# Altium footprint library GBA_V1.PcbLib: 43 footprints (part 1 of 3)
Each footprint in its own frame and in the unit in brackets; x right, y up, seen from the top. Pads: shape width x height; smd on the part's side, far side on the other; paste and mask are expansions set on the pad; w line width, h text height; cw(c..) or ccw(c..) is an arc to the next point about the centre after c.
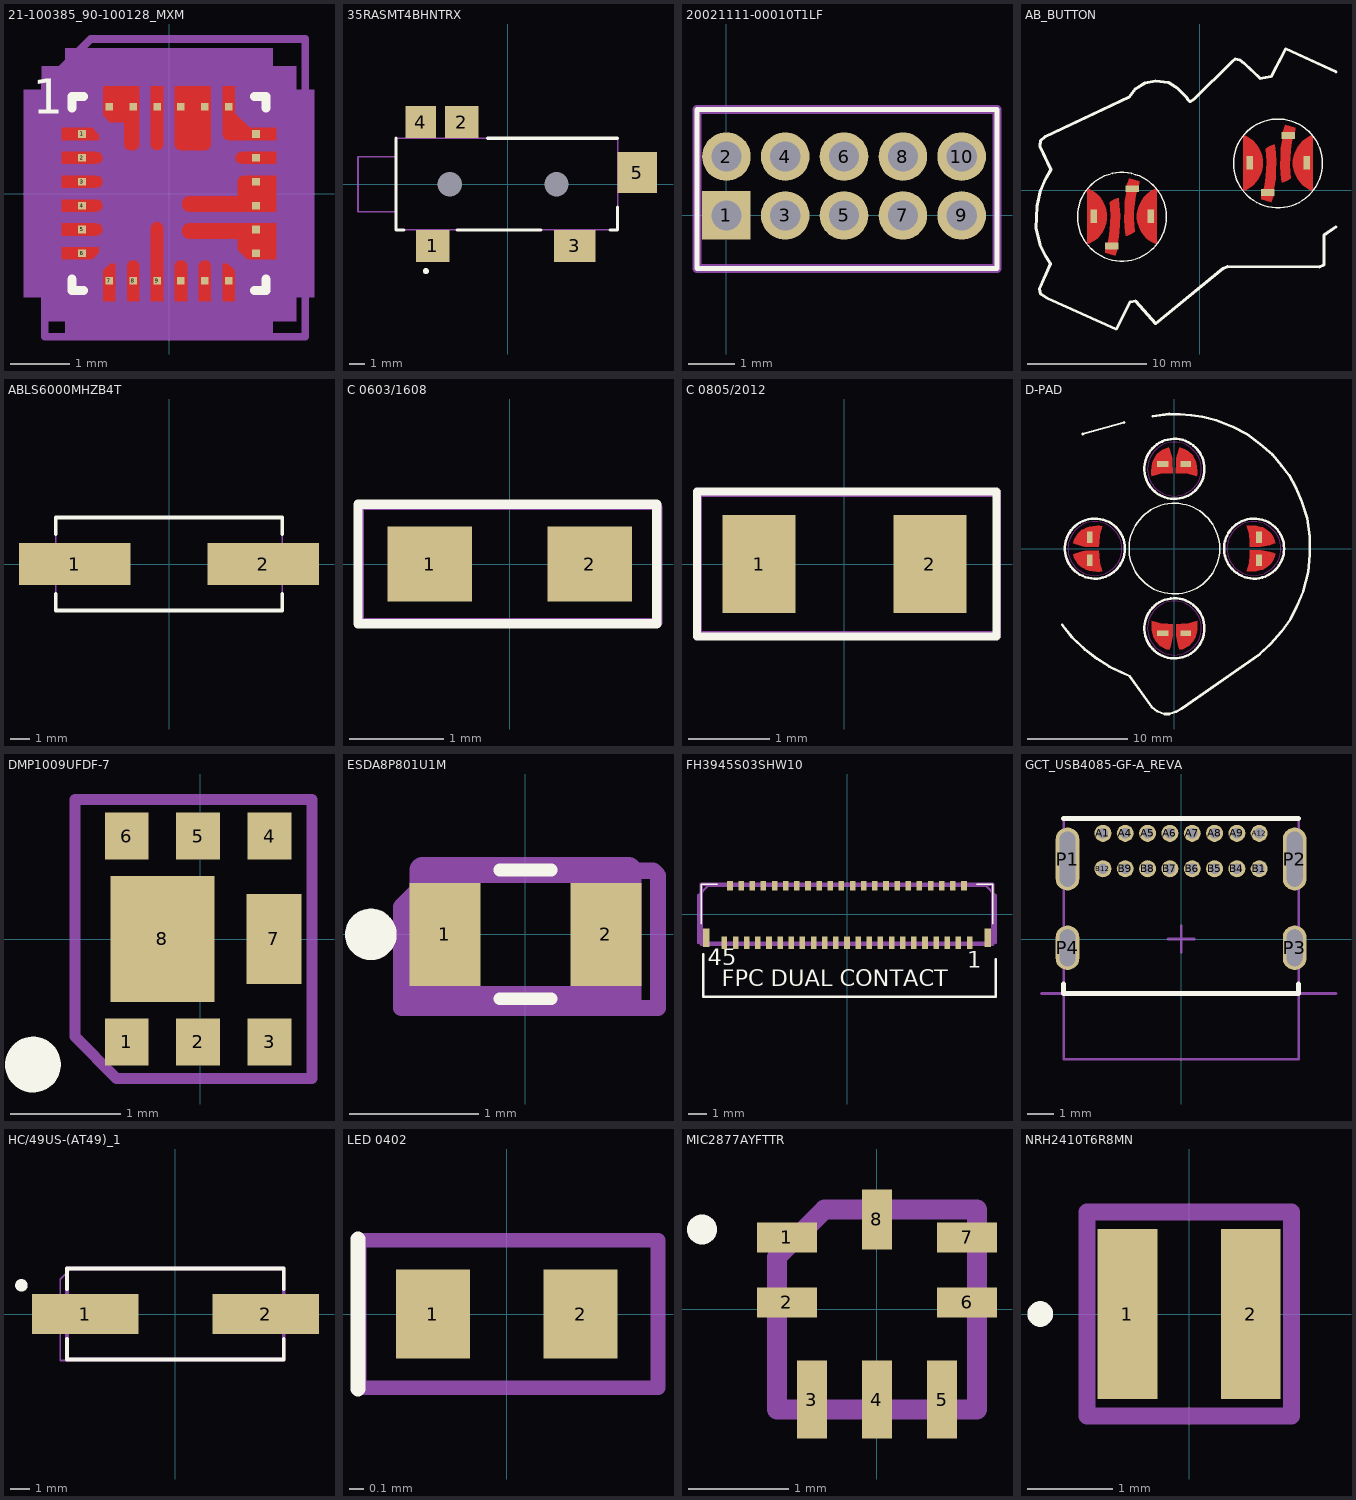
[diagram p0: the footprints below, top view; thin cyan lines are the x and y axes]

## 21-100385_90-100128_MXM [mil]
pads (24):
  rect 5x5 smd: 1(-57.36,39.37) 2(-57.36,23.62) 3(-57.36,7.87) 4(-57.36,-7.87) 5(-57.36,-23.62) 6(-57.36,-39.37) 7(-39.37,-57.36) 8(-23.62,-57.36) 9(-7.87,-57.36) 10(7.87,-57.36) 11(23.62,-57.36) 12(39.37,-57.36) 13(57.36,-39.37) 14(57.36,-23.62) 15(57.36,-7.87) 16(57.36,7.87) 17(57.36,23.62) 18(57.36,39.37) 19(39.37,57.36) 20(23.62,57.36) 21(7.87,57.36) 22(-7.87,57.36) 23(-23.62,57.36) 24(-39.37,57.36)
Top Layer:
  region: -27.62,-47.88 -27.62,-70.86 -19.62,-70.86 -19.62,-47.88 -19.93,-46.35 -20.79,-45.05 -22.09,-44.18 -23.62,-43.88 -25.15,-44.18 -26.45,-45.05 -27.32,-46.35
  region: -11.87,-22.68 -11.87,-70.86 -3.87,-70.86 -3.87,-22.68 -4.18,-21.15 -5.05,-19.85 -6.34,-18.99 -7.87,-18.68 -9.4,-18.99 -10.7,-19.85 -11.57,-21.15
  region: -70.86,-35.37 -46.26,-35.37 -46.26,-38.83 -50.67,-43.37 -70.86,-43.37
  region: -35.37,-70.86 -35.37,-46.26 -38.83,-46.26 -43.37,-50.67 -43.37,-70.86
  region: -47.88,-3.87 -70.86,-3.87 -70.86,-11.87 -47.88,-11.87 -46.35,-11.57 -45.05,-10.7 -44.18,-9.4 -43.88,-7.87 -44.18,-6.34 -45.05,-5.05 -46.35,-4.18
  region: -47.88,-19.62 -70.86,-19.62 -70.86,-27.62 -47.88,-27.62 -46.35,-27.32 -45.05,-26.45 -44.18,-25.15 -43.88,-23.62 -44.18,-22.09 -45.05,-20.79 -46.35,-19.93
  region: -70.86,-35.37 -46.26,-35.37 -46.26,-38.83 -50.67,-43.37 -70.86,-43.37
  region: -3.87,32.56 -3.87,70.86 -11.87,70.86 -11.87,32.56 -11.57,31.03 -10.7,29.73 -9.4,28.87 -7.87,28.56 -6.34,28.87 -5.05,29.73 -4.18,31.03
  region: -70.86,35.37 -46.26,35.37 -46.26,38.83 -50.67,43.37 -70.86,43.37
  region: -47.88,27.62 -70.86,27.62 -70.86,19.62 -47.88,19.62 -46.35,19.93 -45.05,20.79 -44.18,22.09 -43.88,23.62 -44.18,25.15 -45.05,26.45 -46.35,27.32
  region: -47.88,11.87 -70.86,11.87 -70.86,3.87 -47.88,3.87 -46.35,4.18 -45.05,5.05 -44.18,6.34 -43.88,7.87 -44.18,9.4 -45.05,10.7 -46.35,11.57
  region: -43.37,51.65 -43.37,70.86 -19.62,70.86 -19.62,32.56 -19.93,31.03 -20.79,29.73 -22.09,28.87 -23.62,28.56 -25.63,28.56 -27.16,28.87 -28.46,29.73 -29.33,31.03 -29.63,32.56 -29.62,47.24 -38.96,47.24
  region: 3.87,-47.88 3.87,-70.86 11.87,-70.86 11.87,-47.88 11.57,-46.35 10.7,-45.05 9.4,-44.18 7.87,-43.88 6.34,-44.18 5.05,-45.05 4.18,-46.35
  region: 19.62,-47.88 19.62,-70.86 27.62,-70.86 27.62,-47.88 27.32,-46.35 26.45,-45.05 25.15,-44.18 23.62,-43.88 22.09,-44.18 20.79,-45.05 19.93,-46.35
  region: 35.37,-70.86 35.37,-46.26 38.83,-46.26 43.37,-50.67 43.37,-70.86
  region: 51.65,-43.37 70.86,-43.37 70.86,-19.62 12.88,-19.62 11.35,-19.93 10.05,-20.79 9.18,-22.09 8.88,-23.62 8.88,-25.63 9.18,-27.16 10.05,-28.46 11.35,-29.33 12.88,-29.63 45.27,-29.62 45.27,-36.99
  region: 47.88,19.62 70.86,19.62 70.86,27.62 47.88,27.62 46.35,27.32 45.05,26.45 44.18,25.15 43.88,23.62 44.18,22.09 45.05,20.79 46.35,19.93
  region: 3.87,32.56 3.87,70.86 27.62,70.86 27.62,32.56 27.32,31.03 26.45,29.73 25.15,28.87 23.62,28.56 7.87,28.56 6.34,28.87 5.05,29.73 4.18,31.03
  region: 35.37,43.86 35.37,70.86 43.37,70.86 43.37,53.15 53.15,43.37 70.86,43.37 70.86,35.37 43.86,35.37 39.41,35.37 37.88,35.67 36.59,36.54 35.72,37.84 35.41,39.37
  region: 49.26,11.87 70.86,11.87 70.86,-11.87 12.88,-11.87 11.35,-11.57 10.05,-10.7 9.18,-9.4 8.88,-7.87 8.88,-5.87 9.18,-4.34 10.05,-3.04 11.35,-2.17 12.88,-1.87 45.27,-1.87 45.26,7.87 45.56,9.4 46.43,10.7 47.73,11.57
Top Overlay:
  lines w6: -64,-56.47 -64,-64 -56.47,-64 ; -64,56.47 -64,64 -56.47,64 ; 56.47,-64 64,-64 64,-56.47 ; 56.47,64 64,64 64,56.47
  text "1" at -90,45 h39.37
Top Paste:
  drawing of 19 lines, arcs and shapes, not listed
Top Solder:
  drawing of 19 lines, arcs and shapes, not listed
Mechanical 5:
  region: 68.37,95.86 -68.37,95.86 -68.37,84 -84,84 -84,68.37 -95.86,68.37 -95.86,-68.37 -84,-68.37 -84,-84 -68.37,-84 -68.37,-95.86 68.37,-95.86 68.37,-84 84,-84 84,-68.37 95.86,-68.37 95.86,68.37 84,68.37 84,84 68.37,84
Top Assembly:
  lines w5: -82,-94.5 -82,71.5 -51.5,102 90,102 90,-94.5 -82,-94.5
  text ".Designator" at -60.5,-43.5 h39.37
Mechanical 13:
  lines w1: -59,9 -9,59 ; -59,-59 -59,59 59,59 59,-59 -59,-59
Mechanical 15:
  region: 53.37,80.86 -53.37,80.86 -53.37,69 -69,69 -69,53.37 -80.86,53.37 -80.86,-53.37 -69,-53.37 -69,-69 -53.37,-69 -53.37,-80.86 53.37,-80.86 53.37,-69 69,-69 69,-53.37 80.86,-53.37 80.86,53.37 69,53.37 69,69 53.37,69
  lines w6: -80.86,-53.37 -69,-53.37 -69,-69 -53.37,-69 -53.37,-80.86 53.37,-80.86 53.37,-69 69,-69 69,-53.37 80.86,-53.37 80.86,53.37 69,53.37 69,69 53.37,69 53.37,80.86 -53.37,80.86 -53.37,69 -69,69 -69,53.37 -80.86,53.37 -80.86,-53.37
3D body: height 10, standoff 0, extent -60,-60 60,60

## 35RASMT4BHNTRX [mm]
pads (7):
  rect 2.2x2.1 smd: 1(-4.9,-4.05) 2(-3,4.05)
  rect 2.7x2.1 smd: 3(4.4,-4.05)
  rect 2x2.1 smd: 4(-5.7,4.05)
  rect 2.6x2.7 smd: 5(8.5,0.75)
  round 0.8 hole 1.6 unplated: MH1(-3.8,0) MH2(3.2,0)
Top Overlay:
  lines w0.2: -7.3,3 -7.3,-3 -6.8,-3 ; -3.3,-3 2.2,-3 ; -1.3,3 7.2,3 ; 6.7,-3 7.2,-3 7.2,-1.5 ; -5.45,-5.7 ccw(c-5.35,-5.7) -5.25,-5.7 ccw(c-5.35,-5.7) -5.45,-5.7
Mechanical 5:
  lines w0.1: -7.3,-1.8 -9.8,-1.8 -9.8,1.8 -7.3,1.8 ; -7.3,-3 7.2,-3 7.2,3 -7.3,3 -7.3,-3
  text ".Designator" at -1.651,0.635 h1
3D body "35RASMT4BHNTRX.STEP": height 5.1, standoff -0.89, extent -9.71,-4.562 9.29,4.43

## 20021111-00010T1LF [mm]
pads (10):
  rect 1.05x1.05 hole 0.65: 1(0,0)
  round 1.05 hole 0.65: 2(0,1.27) 3(1.27,0) 4(1.27,1.27) 5(2.54,0) 6(2.54,1.27) 7(3.81,0) 8(3.81,1.27) 9(5.08,0) 10(5.08,1.27)
Top Overlay:
  lines w0.1: -0.635,-1.145 -0.635,2.286 5.842,2.286 5.842,-1.145 -0.635,-1.145
Top Assembly:
  lines w0.2: -0.635,-1.145 5.842,-1.145 5.842,2.286 -0.635,2.286 -0.635,-1.145
  text ".Designator" at 0.381,0.254 h1
3D body "20021111-00010XXLFc.stp": height 5.5, standoff -2.35, extent -0.635,-1.143 5.715,2.257

## AB_BUTTON [mm]
pads (8):
  rect 0.575x1.149 smd paste-1: A_1(4.182,2.298) A_2(8.961,2.298) B_1(-8.915,-2.183) B_2(-4.136,-2.183)
  rect 1.149x0.575 smd paste-1: A_1(7.422,4.595) A_2(5.698,-0.207) B_1(-5.675,0.115) B_2(-7.399,-4.687)
Top Layer:
  region: -5.101,0.758 -5.928,0.988 -6.135,0.391 -6.066,0.23 -6.181,-0.322 -6.296,-0.965 -6.319,-1.654 -6.342,-2.412 -6.296,-3.171 -6.227,-3.814 -6.089,-3.814 -5.79,-3.699 -5.491,-3.492 -5.515,-2.964 -5.561,-2.367 -5.537,-1.769 -5.469,-1.126 -5.377,-0.414 -5.285,0 -5.124,0.207
  region: -7.95,-5.262 -7.123,-5.491 -6.916,-4.894 -6.985,-4.733 -6.87,-4.182 -6.755,-3.538 -6.732,-2.849 -6.709,-2.091 -6.755,-1.333 -6.824,-0.689 -6.962,-0.689 -7.261,-0.804 -7.56,-1.011 -7.536,-1.539 -7.49,-2.137 -7.514,-2.734 -7.582,-3.378 -7.674,-4.09 -7.766,-4.503 -7.927,-4.71
  region: 5.147,-0.781 5.974,-1.011 6.181,-0.414 6.112,-0.253 6.227,0.299 6.342,0.942 6.365,1.631 6.388,2.39 6.342,3.148 6.273,3.791 6.135,3.791 5.836,3.676 5.537,3.47 5.561,2.941 5.607,2.344 5.583,1.746 5.515,1.103 5.423,0.391 5.331,-0.023 5.17,-0.23
  region: 7.996,5.239 7.169,5.469 6.962,4.871 7.031,4.71 6.916,4.159 6.801,3.516 6.778,2.826 6.755,2.068 6.801,1.31 6.87,0.666 7.008,0.666 7.307,0.781 7.606,0.988 7.582,1.516 7.536,2.114 7.56,2.711 7.628,3.355 7.72,4.067 7.812,4.481 7.973,4.687
  region: -3.646,-4.546 -3.646,0.134 -3.825,0.069 -4.16,-0.114 -4.463,-0.345 -4.727,-0.621 -4.946,-0.933 -5.115,-1.275 -5.23,-1.638 -5.288,-2.015 -5.288,-2.397 -5.23,-2.773 -5.115,-3.137 -4.946,-3.479 -4.727,-3.791 -4.463,-4.066 -4.16,-4.298 -3.825,-4.481
  region: -9.451,0.134 -9.451,-4.546 -9.272,-4.481 -8.937,-4.298 -8.634,-4.066 -8.37,-3.791 -8.151,-3.479 -7.982,-3.137 -7.867,-2.773 -7.809,-2.397 -7.809,-2.015 -7.867,-1.638 -7.982,-1.275 -8.151,-0.933 -8.37,-0.621 -8.634,-0.345 -8.937,-0.114 -9.272,0.069
  region: 3.646,4.615 3.646,-0.065 3.825,0 4.16,0.183 4.463,0.414 4.727,0.689 4.946,1.002 5.115,1.343 5.23,1.707 5.288,2.084 5.288,2.465 5.23,2.842 5.115,3.206 4.946,3.548 4.727,3.86 4.463,4.135 4.16,4.367 3.825,4.55
  region: 9.451,-0.065 9.451,4.615 9.272,4.55 8.937,4.367 8.634,4.135 8.37,3.86 8.151,3.548 7.982,3.206 7.867,2.842 7.809,2.465 7.809,2.084 7.867,1.707 7.982,1.343 8.151,1.002 8.37,0.689 8.634,0.414 8.937,0.183 9.272,0
Top Overlay:
  circle w0.127: c-6.548,-2.24 r3.727
  circle w0.127: c6.548,2.24 r3.727
  lines w0.253: 11.42,-3.079 10.409,-3.768 10.409,-6.296 10.018,-6.457 2.321,-6.411 1.953,-6.571 -3.722,-11.213 -5.4,-9.329 -5.859,-9.375 -7.031,-11.672 -12.821,-9.076 -13.396,-8.708 -13.488,-8.318 -12.546,-6.181 -12.982,-5.491 -13.442,-4.549 -13.763,-3.194 -13.671,-1.356 -13.373,0 -12.982,0.896 -12.5,1.723 -13.442,3.699 -13.396,4.159 -13.005,4.481 -5.951,7.812 -5.446,8.479 -4.618,8.984 -3.722,9.145 -2.642,9.03 -1.907,8.57 -1.126,7.789 -1.011,7.582 -0.827,7.422 -0.505,7.628 2.688,10.776 2.987,11.006 3.309,10.937 3.699,10.661 5.055,9.375 5.974,9.535 7.192,11.856 11.42,9.926
Top Solder:
  drawing of 8 lines, arcs and shapes, not listed
Mechanical 5:
  text ".Designator" at -1.609,-0.224 h1

## ABLS6000MHZB4T [mm]
pads (2):
  rect 5.6x2.1 smd: 1(-4.75,0) 2(4.75,0)
Top Overlay:
  lines w0.2: -5.7,-1.5 -5.7,-2.35 5.7,-2.35 5.7,-1.5 ; -5.7,1.5 -5.7,2.35 5.7,2.35 5.7,1.5
Mechanical 5:
  lines w0.1: -5.7,-2.35 5.7,-2.35 5.7,2.35 -5.7,2.35 -5.7,-2.35
  text ".Designator" at -2.286,-0.497 h1
3D body "ABLS-6.000MHZ-B4-T.stp": height 4.3, standoff 0, extent -7.34,-2.35 7.34,2.35

## C 0603/1608 [mm]
pads (2):
  rect 0.9x0.8 smd: 1(-0.85,0) 2(0.85,0)
Top Overlay:
  lines w0.1: -1.612,-0.635 1.563,-0.635 1.563,0.635 -1.612,0.635 -1.612,-0.635
Top Designator:
  lines w0.1: -1.6,-0.625 1.575,-0.625 1.575,0.6 1.55,0.625 -1.6,0.625 -1.6,-0.625
  text ".Designator" at -1.4,-0.4 h0.8
3D body: height 0.64, standoff 0, extent 0.85,-0.4 1.3,0.4
3D body: height 0.64, standoff 0, extent -1.3,-0.4 -0.85,0.4
3D body: height 0.64, standoff 0, extent -0.85,-0.4 0.85,0.4

## C 0805/2012 [mm]
pads (2):
  rect 0.9x1.2 smd: 1(-1.05,0) 2(1.05,0)
Top Overlay:
  lines w0.1: -1.812,-0.889 -1.812,0.889 1.871,0.889 1.871,-0.889 -1.812,-0.889
Top Designator:
  lines w0.1: -1.8,-0.875 -1.8,0.85 -1.775,0.875 1.875,0.875 1.875,-0.875 -1.8,-0.875
  text ".Designator" at -1.675,-0.55 h1
3D body: height 0.64, standoff 0, extent -1.05,-0.6 1.1,0.6
3D body: height 0.64, standoff 0, extent -1.5,-0.6 -1.05,0.6
3D body: height 0.64, standoff 0, extent 1.1,-0.6 1.5,0.6

## D-PAD [mm]
pads (8):
  rect 1.039x0.575 smd: DOWN(1.149,-8.444) GND(1.149,8.444)
  rect 0.575x1.149 smd: GND(-8.444,1.149) GND(8.444,-1.149) LEFT(-8.444,-1.149) RIGHT(8.444,1.149)
  rect 1.149x0.575 smd: GND(-1.149,-8.444) UP(-1.149,8.444)
Top Layer:
  region: -7.548,0.161 -8.697,0.184 -8.973,0.207 -9.225,0.253 -9.524,0.322 -9.869,0.437 -10.099,0.529 -10.029,0.804 -9.937,1.034 -9.823,1.241 -9.685,1.448 -9.455,1.677 -9.248,1.861 -9.064,1.953 -8.812,2.091 -8.513,2.183 -8.168,2.252 -7.732,2.275 -7.433,2.275 -7.226,2.252 -7.456,1.402 -7.525,0.643
  region: -7.548,-0.184 -8.697,-0.207 -8.973,-0.23 -9.225,-0.276 -9.524,-0.345 -9.869,-0.459 -10.099,-0.551 -10.029,-0.827 -9.937,-1.057 -9.823,-1.264 -9.685,-1.471 -9.455,-1.7 -9.248,-1.884 -9.064,-1.976 -8.812,-2.114 -8.513,-2.206 -8.168,-2.275 -7.732,-2.298 -7.433,-2.298 -7.226,-2.275 -7.456,-1.425 -7.525,-0.666
  region: 0.161,7.548 0.184,8.697 0.207,8.973 0.253,9.225 0.322,9.524 0.437,9.869 0.529,10.099 0.804,10.029 1.034,9.937 1.241,9.823 1.448,9.685 1.677,9.455 1.861,9.248 1.953,9.064 2.091,8.812 2.183,8.513 2.252,8.168 2.275,7.732 2.275,7.433 2.252,7.226 1.402,7.456 0.643,7.525
  region: -0.184,7.548 -0.207,8.697 -0.23,8.973 -0.276,9.225 -0.345,9.524 -0.459,9.869 -0.551,10.099 -0.827,10.029 -1.057,9.937 -1.264,9.823 -1.471,9.685 -1.7,9.455 -1.884,9.248 -1.976,9.064 -2.114,8.812 -2.206,8.513 -2.275,8.168 -2.298,7.732 -2.298,7.433 -2.275,7.226 -1.425,7.456 -0.666,7.525
  region: -0.161,-7.548 -0.184,-8.697 -0.207,-8.973 -0.253,-9.225 -0.322,-9.524 -0.437,-9.869 -0.529,-10.099 -0.804,-10.029 -1.034,-9.937 -1.241,-9.823 -1.448,-9.685 -1.677,-9.455 -1.861,-9.248 -1.953,-9.064 -2.091,-8.812 -2.183,-8.513 -2.252,-8.168 -2.275,-7.732 -2.275,-7.433 -2.252,-7.226 -1.402,-7.456 -0.643,-7.525
  region: 0.184,-7.548 0.207,-8.697 0.23,-8.973 0.276,-9.225 0.345,-9.524 0.459,-9.869 0.551,-10.099 0.827,-10.029 1.057,-9.937 1.264,-9.823 1.471,-9.685 1.7,-9.455 1.884,-9.248 1.976,-9.064 2.114,-8.812 2.206,-8.513 2.275,-8.168 2.298,-7.732 2.298,-7.433 2.275,-7.226 1.425,-7.456 0.666,-7.525
  region: 7.548,0.184 8.697,0.207 8.973,0.23 9.225,0.276 9.524,0.345 9.869,0.459 10.099,0.551 10.029,0.827 9.937,1.057 9.823,1.264 9.685,1.471 9.455,1.7 9.248,1.884 9.064,1.976 8.812,2.114 8.513,2.206 8.168,2.275 7.732,2.298 7.433,2.298 7.226,2.275 7.456,1.425 7.525,0.666
  region: 7.548,-0.161 8.697,-0.184 8.973,-0.207 9.225,-0.253 9.524,-0.322 9.869,-0.437 10.099,-0.529 10.029,-0.804 9.937,-1.034 9.823,-1.241 9.685,-1.448 9.455,-1.677 9.248,-1.861 9.064,-1.953 8.812,-2.091 8.513,-2.183 8.168,-2.252 7.732,-2.275 7.433,-2.275 7.226,-2.252 7.456,-1.402 7.525,-0.643
Top Layer keep-out:
  circle w0.102: c-7.941,0 r2.693
  circle w0.102: c0,7.941 r2.693
  circle w0.102: c7.941,0 r2.693
  circle w0.102: c0,-7.941 r2.693
Top Overlay:
  circle w0.253: c-7.941,0 r2.998
  circle w0.253: c0,7.962 r2.998
  circle w0.127: c0,0 r4.527
  circle w0.253: c7.962,0 r2.998
  circle w0.253: c0,-7.962 r2.998
  lines w0.253: -11.213,-7.606 -10.202,-8.869 -8.938,-10.087 -7.72,-11.006 -6.48,-11.787 -5.216,-12.408 -4.481,-12.729 -2.252,-15.831 -1.7,-16.268 -0.988,-16.521 -0.529,-16.521 0.161,-16.291 0.712,-15.992 8.524,-10.547 9.605,-9.513 10.684,-8.295 11.58,-7.054 12.224,-5.79 12.89,-4.228 13.373,-2.344 13.534,-0.62 13.511,1.195 13.281,3.033 12.706,4.71 12.109,6.112 11.466,7.33 10.684,8.295 9.788,9.398 8.548,10.455 7.284,11.42 5.813,12.155 4.182,12.821 2.803,13.166 1.677,13.327 0.529,13.419 -0.505,13.442 -2.183,13.212 ; -9.168,11.443 -5.032,12.592
Top Solder:
  drawing of 8 lines, arcs and shapes, not listed
Mechanical 5:
  text ".Designator" at 0.782,-1.855 h1

## DMP1009UFDF-7 [mm]
pads (8):
  rect 0.4x0.425 smd: 1(-0.67,-0.937) 2(-0.02,-0.937) 3(0.63,-0.937) 4(0.63,0.938) 5(-0.02,0.938) 6(-0.67,0.938)
  rect 0.5x0.82 smd: 7(0.67,0)
  rect 0.95x1.15 smd: 8(-0.345,0)
Top Overlay:
  circle w0.254: c-1.524,-1.143 r0.127
Top Designator:
  lines w0.1: -1.143,-0.889 -0.762,-1.27 1.016,-1.27 1.016,1.27 -1.143,1.27 -1.143,-0.889
  text ".Designator" at -1.143,-0.508 h1
3D body "User Library-SOT1118 DFN2020-6.step": height 0.65, standoff 0, extent -1.004,-1.016 1.004,1.064

## ESDA8P801U1M [mm]
pads (2):
  rect 0.55x0.8 smd: 1(-0.625,0) 2(0.625,0)
Top Overlay:
  lines w0.1: -0.2,-0.5 0.2,-0.5 ; -0.2,0.5 0.2,0.5
  lines w0.2: -1.2,-0.1 cw(c-1.2,0) -1.2,0.1 cw(c-1.2,0) -1.2,-0.1
Top Assembly:
  lines w0.127: -0.965,-0.572 1.029,-0.572 1.029,0.457 0.991,0.495 -0.686,0.495 -0.965,0.216 -0.965,-0.572
  text ".Designator" at -0.838,-0.419 h1
Mechanical 13:
  lines w0.2: -0.8,-0.5 -0.8,0.5 0.8,0.5 0.8,-0.5 -0.8,-0.5

## FH3945S03SHW10 [mm]
pads (47):
  rect 0.3x0.67 smd: 1(6.6,-1.533) 3(6,-1.533) 5(5.4,-1.533) 7(4.8,-1.533) 9(4.2,-1.533) 11(3.6,-1.533) 13(3,-1.533) 15(2.4,-1.533) 17(1.8,-1.533) 19(1.2,-1.533) 21(0.6,-1.533) 23(0,-1.533) 25(-0.6,-1.533) 27(-1.2,-1.533) 29(-1.8,-1.533) 31(-2.4,-1.533) 33(-3,-1.533) 35(-3.6,-1.533) 37(-4.2,-1.533) 39(-4.8,-1.533) 41(-5.4,-1.533) 43(-6,-1.533) 45(-6.6,-1.533)
  rect 0.3x0.5 smd: 2(6.3,1.532) 4(5.7,1.532) 6(5.1,1.532) 8(4.5,1.532) 10(3.9,1.532) 12(3.3,1.532) 14(2.7,1.532) 16(2.1,1.532) 18(1.5,1.532) 20(0.9,1.532) 22(0.3,1.532) 24(-0.3,1.532) 26(-0.9,1.532) 28(-1.5,1.532) 30(-2.1,1.532) 32(-2.7,1.532) 34(-3.3,1.532) 36(-3.9,1.532) 38(-4.5,1.532) 40(-5.1,1.532) 42(-5.7,1.532) 44(-6.3,1.532)
  rect 0.35x1 smd: 46(-7.575,-1.268) 47(7.575,-1.268)
Top Overlay:
  lines w0.1: -7.85,-0.5 -7.85,1.613 -7,1.613 ; 7,1.613 7.85,1.613 7.85,-0.5
  lines w0.127: -7.747,-2.159 -7.747,-4.445 8.001,-4.445 8.001,-2.413
  text "1" at 6.477,-3.175 h1.5
  text "FPC DUAL CONTACT" at -6.731,-4.175 h1.5
  text "45" at -7.493,-3.032 h1.5
Mechanical 5:
  lines w0.127: -8.001,-1.524 8.001,-1.524 8.001,1.016 7.493,1.524 -7.493,1.524 -8.001,1.016 -8.001,-1.524
  text ".Designator" at -2.415,-0.37 h1
Mechanical 13:
  lines w0.2: -7.85,-1.613 -7.85,1.613 7.85,1.613 7.85,-1.613 -7.85,-1.613
3D body "FH39-45S-0.3SHW_10_.stp": height 1.99, standoff 0, extent -7.85,-1.838 7.85,1.752

## GCT_USB4085-GF-A_REVA [mm]
pads (20):
  round 0.65 hole 0.4: A1(-2.975,4.025) A4(-2.125,4.025) A5(-1.275,4.025) A6(-0.425,4.025) A7(0.425,4.025) A8(1.275,4.025) A9(2.125,4.025) A12(2.975,4.025) B1(2.975,2.675) B4(2.125,2.675) B5(1.275,2.675) B6(0.425,2.675) B7(-0.425,2.675) B8(-1.275,2.675) B9(-2.125,2.675) B12(-2.975,2.675)
  oval 0.9x2.4 hole 0.6 slot 2.1 at 90 deg: P1(-4.325,3.045) P2(4.325,3.045)
  oval 0.9x1.7 hole 0.6 slot 1.4 at 90 deg: P3(4.325,-0.335) P4(-4.325,-0.335)
Top Overlay:
  lines w0.2: -4.475,-1.725 -4.475,-2.075 4.475,-2.075 4.475,-1.725 ; -4.475,4.585 4.475,4.585
Top Assembly:
  lines w0.1: -4.475,-4.585 -4.475,4.585 4.475,4.585 4.475,-4.585 -4.475,-4.585
  text ".Designator" at -2.159,-0.508 h1
Mechanical 15:
  lines w0.1: -0.5,0 0.5,0 ; 0,-0.5 0,0.5
Mechanical 16:
  lines w0.127: -5.3,-2.075 5.9,-2.075
  text ">PCB Edge" at 5.7,-2.075 h1.57
3D body "USB4085-03-A_revA.STEP": height 3.46, standoff -2.1, extent -4.515,-4.564 4.515,4.606

## HC/49US-(AT49)_1 [mm]
pads (2):
  rect 5.6x2.1 smd: 1(-4.75,0) 2(4.75,0)
Top Overlay:
  circle w0.4: c-8.105,1.51 r0.126
  lines w0.2: -5.7,-1.3 -5.7,-2.4 5.7,-2.4 5.7,-1.3 ; -5.7,1.3 -5.7,2.4 5.7,2.4 5.7,1.3
Mechanical 13:
  lines w0.2: -5.7,-2.4 -5.7,2.4 5.7,2.4 5.7,-2.4 -5.7,-2.4
Top Designator:
  lines w0.1: -6.06,-2.45 -6.06,1.84 -5.52,2.38 5.74,2.38 5.74,-2.45 -6.06,-2.45
  text ".Designator" at -3.16,-1.36 h1.52
3D body "User Library-HC49US.STEP": height 4.2, standoff 0, extent -6.16,-2.35 6.54,2.35

## LED 0402 [mm]
pads (2):
  rect 0.5x0.6 smd: 1(-0.5,0) 2(0.5,0)
Top Overlay:
  lines w0.1: -1.008,-0.508 -1.008,0.508
Top Designator:
  lines w0.1: -1,-0.5 1.025,-0.5 1.025,0.5 -1,0.5 -1,-0.5
  text ".Designator" at -0.85,-0.3 h0.6
3D body "User Library-LED-0402.step": height 0.45, standoff 0, extent -0.505,-0.25 0.505,0.25

## MIC2877AYFTTR [mm]
pads (8):
  rect 0.6x0.3 smd: 1(-0.9,0.72) 2(-0.9,0.07) 6(0.9,0.07) 7(0.9,0.72)
  rect 0.3x0.78 smd: 3(-0.65,-0.9) 4(0,-0.9) 5(0.65,-0.9)
  rect 0.3x0.6 smd: 8(0,0.9)
Top Overlay:
  lines w0.2: -1.8,0.8 ccw(c-1.75,0.8) -1.7,0.8 ; -1.8,0.8 cw(c-1.75,0.8) -1.7,0.8 ; -1.8,0.8 ccw(c-1.75,0.8) -1.7,0.8
Mechanical 5:
  lines w0.2: -1,-1 1,-1 1,1 -0.524,1 -1,0.524 -1,-1
  text ".Designator" at -0.889,-0.635 h1
3D body "MIC2877-AYFT-TR.stp": height 0.7, standoff 0, extent -1,-1 1,1

## NRH2410T6R8MN [mm]
pads (2):
  rect 0.7x2 smd: 1(-0.725,0) 2(0.725,0)
Top Overlay:
  lines w0.2: -1.8,0 ccw(c-1.75,0) -1.7,0 ; -1.8,0 cw(c-1.75,0) -1.7,0 ; -1.8,0 ccw(c-1.75,0) -1.7,0
Mechanical 5:
  lines w0.2: -1.2,-1.2 1.2,-1.2 1.2,1.2 -1.2,1.2 -1.2,-1.2
  text ".Designator" at -1.016,-0.635 h1
3D body "NRH2410T6R8MN.stp": height 1.1, standoff 0, extent -1.2,-1.2 1.2,1.2